# Altium schematic symbol library SCHLIB.SchLib: 2608 symbols (part 13 of 20) (continued)
## R-6.49R-0603 (continued)
RES SMD 6.49 OHM 1% 1/10W 0603; Manufacturer Part Number: CRCW06036R49FKEA; Manufacturer: Vishay Dale; Tolerance: 0.01; Power: 0.1W; Temperature Coefficient: ±100ppm/°C; Object  Type: Part; Design Item ID: R-6.49R-0603; Value: 6.49R; Composition: Thick Film; Features: Automotive AEC-Q200; Operating Temperature: -55°C ~ 155°C; Height - Seated (Max): 0.50mm; Category: Resistor
footprint R0603
pins: 1, 2

## R-6.65K-0402
designator R?, comment Package: 0402  (hidden comment: 6.65K)
RES 6.65K OHM 1% 1/16W 0402; Manufacturer Part Number: RC0402FR-076K65L; Manufacturer: YAGEO; Tolerance: 0.01; Power: 0.063W; Temperature Coefficient: ±100ppm/°C; Object  Type: Part; Design Item ID: R-6.65K-0402; Value: 6.65K; Composition: Thick Film; Features: Moisture Resistant; Operating Temperature: -55°C ~ 155°C; Height - Seated (Max): 0.40mm; Category: Resistor
footprint R0402
pins: 1, 2

## R-6.65K-0603
designator R?, comment Package: 0603  (hidden comment: 6.65K)
RES SMD 6.65K OHM 1% 1/10W 0603; Manufacturer Part Number: CRCW06036K65FKEA; Manufacturer: Vishay Dale; Tolerance: 0.01; Power: 0.1W; Temperature Coefficient: ±100ppm/°C; Object  Type: Part; Design Item ID: R-6.65K-0603; Value: 6.65K; Composition: Thick Film; Features: Automotive AEC-Q200; Operating Temperature: -55°C ~ 155°C; Height - Seated (Max): 0.50mm; Category: Resistor
footprint R0603
pins: 1, 2

## R-6.65M-0603
designator R?, comment Package: 0603  (hidden comment: 6.65M)
RES SMD 6.65M OHM 1% 1/10W 0603; Manufacturer Part Number: CRCW06036M65FKEA; Manufacturer: Vishay Dale; Tolerance: 0.01; Power: 0.1W; Temperature Coefficient: ±100ppm/°C; Object  Type: Part; Design Item ID: R-6.65M-0603; Value: 6.65M; Composition: Thick Film; Features: Automotive AEC-Q200; Operating Temperature: -55°C ~ 155°C; Height - Seated (Max): 0.50mm; Category: Resistor
footprint R0603
pins: 1, 2

## R-6.65R-0603
designator R?, comment Package: 0603  (hidden comment: 6.65R)
RES SMD 6.65 OHM 1% 1/10W 0603; Manufacturer Part Number: CRCW06036R65FKEA; Manufacturer: Vishay Dale; Tolerance: 0.01; Power: 0.1W; Temperature Coefficient: ±100ppm/°C; Object  Type: Part; Design Item ID: R-6.65R-0603; Value: 6.65R; Composition: Thick Film; Features: Automotive AEC-Q200; Operating Temperature: -55°C ~ 155°C; Height - Seated (Max): 0.50mm; Category: Resistor
footprint R0603
pins: 1, 2

## R-6.81K-0402
designator R?, comment Package: 0402  (hidden comment: 6.81K)
RES 6.81K OHM 1% 1/16W 0402; Manufacturer Part Number: RC0402FR-076K81L; Manufacturer: YAGEO; Tolerance: 0.01; Power: 0.063W; Temperature Coefficient: ±100ppm/°C; Object  Type: Part; Design Item ID: R-6.81K-0402; Value: 6.81K; Composition: Thick Film; Features: Moisture Resistant; Operating Temperature: -55°C ~ 155°C; Height - Seated (Max): 0.40mm; Category: Resistor
footprint R0402
pins: 1, 2

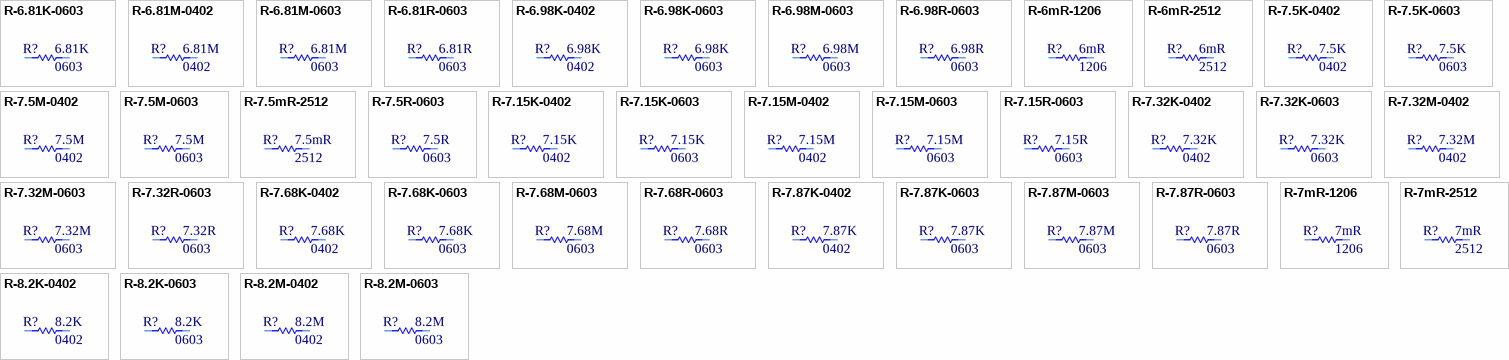
[diagram p55: symbols R-6.81K-0603 to R-8.2M-0603]

## R-6.81K-0603
designator R?, comment Package: 0603  (hidden comment: 6.81K)
RES SMD 6.81K OHM 1% 1/10W 0603; Manufacturer Part Number: CRCW06036K81FKEA; Manufacturer: Vishay Dale; Tolerance: 0.01; Power: 0.1W; Temperature Coefficient: ±100ppm/°C; Object  Type: Part; Design Item ID: R-6.81K-0603; Value: 6.81K; Composition: Thick Film; Features: Automotive AEC-Q200; Operating Temperature: -55°C ~ 155°C; Height - Seated (Max): 0.50mm; Category: Resistor
footprint R0603
pins: 1, 2

## R-6.81M-0402
designator R?, comment Package: 0402  (hidden comment: 6.81M)
RES 6.81M OHM 1% 1/16W 0402; Manufacturer Part Number: RC0402FR-076M81L; Manufacturer: YAGEO; Tolerance: 0.01; Power: 0.063W; Temperature Coefficient: ±100ppm/°C; Object  Type: Part; Design Item ID: R-6.81M-0402; Value: 6.81M; Composition: Thick Film; Features: Moisture Resistant; Operating Temperature: -55°C ~ 155°C; Height - Seated (Max): 0.40mm; Category: Resistor
footprint R0402
pins: 1, 2

## R-6.81M-0603
designator R?, comment Package: 0603  (hidden comment: 6.81M)
RES SMD 6.81M OHM 1% 1/10W 0603; Manufacturer Part Number: CRCW06036M81FKEA; Manufacturer: Vishay Dale; Tolerance: 0.01; Power: 0.1W; Temperature Coefficient: ±100ppm/°C; Object  Type: Part; Design Item ID: R-6.81M-0603; Value: 6.81M; Composition: Thick Film; Features: Automotive AEC-Q200; Operating Temperature: -55°C ~ 155°C; Height - Seated (Max): 0.50mm; Category: Resistor
footprint R0603
pins: 1, 2

## R-6.81R-0603
designator R?, comment Package: 0603  (hidden comment: 6.81R)
RES SMD 6.81 OHM 1% 1/10W 0603; Manufacturer Part Number: CRCW06036R81FKEA; Manufacturer: Vishay Dale; Tolerance: 0.01; Power: 0.1W; Temperature Coefficient: ±100ppm/°C; Object  Type: Part; Design Item ID: R-6.81R-0603; Value: 6.81R; Composition: Thick Film; Features: Automotive AEC-Q200; Operating Temperature: -55°C ~ 155°C; Height - Seated (Max): 0.50mm; Category: Resistor
footprint R0603
pins: 1, 2

## R-6.98K-0402
designator R?, comment Package: 0402  (hidden comment: 6.98K)
RES 6.98K OHM 1% 1/16W 0402; Manufacturer Part Number: RC0402FR-076K98L; Manufacturer: YAGEO; Tolerance: 0.01; Power: 0.063W; Temperature Coefficient: ±100ppm/°C; Object  Type: Part; Design Item ID: R-6.98K-0402; Value: 6.98K; Composition: Thick Film; Features: Moisture Resistant; Operating Temperature: -55°C ~ 155°C; Height - Seated (Max): 0.40mm; Category: Resistor
footprint R0402
pins: 1, 2

## R-6.98K-0603
designator R?, comment Package: 0603  (hidden comment: 6.98K)
RES SMD 6.98K OHM 1% 1/10W 0603; Manufacturer Part Number: CRCW06036K98FKEA; Manufacturer: Vishay Dale; Tolerance: 0.01; Power: 0.1W; Temperature Coefficient: ±100ppm/°C; Object  Type: Part; Design Item ID: R-6.98K-0603; Value: 6.98K; Composition: Thick Film; Features: Automotive AEC-Q200; Operating Temperature: -55°C ~ 155°C; Height - Seated (Max): 0.50mm; Category: Resistor
footprint R0603
pins: 1, 2

## R-6.98M-0603
designator R?, comment Package: 0603  (hidden comment: 6.98M)
RES SMD 6.98M OHM 1% 1/10W 0603; Manufacturer Part Number: CRCW06036M98FKEA; Manufacturer: Vishay Dale; Tolerance: 0.01; Power: 0.1W; Temperature Coefficient: ±100ppm/°C; Object  Type: Part; Design Item ID: R-6.98M-0603; Value: 6.98M; Composition: Thick Film; Features: Automotive AEC-Q200; Operating Temperature: -55°C ~ 155°C; Height - Seated (Max): 0.50mm; Category: Resistor
footprint R0603
pins: 1, 2

## R-6.98R-0603
designator R?, comment Package: 0603  (hidden comment: 6.98R)
RES SMD 6.98 OHM 1% 1/10W 0603; Manufacturer Part Number: CRCW06036R98FKEA; Manufacturer: Vishay Dale; Tolerance: 0.01; Power: 0.1W; Temperature Coefficient: ±100ppm/°C; Object  Type: Part; Design Item ID: R-6.98R-0603; Value: 6.98R; Composition: Thick Film; Features: Automotive AEC-Q200; Operating Temperature: -55°C ~ 155°C; Height - Seated (Max): 0.50mm; Category: Resistor
footprint R0603
pins: 1, 2

## R-6mR-1206
designator R?, comment Package: 1206  (hidden comment: 6mR)
RES 0.006 OHM 1% 1/4W 1206; Manufacturer Part Number: WSL12066L000FEA; Manufacturer: Vishay Dale; Tolerance: 0.01; Power: 0.25W; Temperature Coefficient: ±110ppm/°C; Object  Type: Part; Design Item ID: R-6mR-1206; Value: 6mR; Composition: Metal Element; Features: Anti-Sulfur, Automotive AEC-Q200, Current Sense, Moisture Resistant, Pulse Withstanding; Operating Temperature: -65°C ~ 170°C; Height - Seated (Max): 0.89mm; Category: Resistor
footprint R1206
pins: 1, 2

## R-6mR-2512
designator R?, comment Package: 2512  (hidden comment: 6mR)
RES 0.006 OHM 1% 1W 2512; Manufacturer Part Number: WSL25126L000FEA; Manufacturer: Vishay Dale; Tolerance: 0.01; Temperature Coefficient: ±110ppm/°C; Object  Type: Part; Design Item ID: R-6mR-2512; Value: 6mR; Power: 1W; Composition: Metal Element; Features: Anti-Sulfur, Automotive AEC-Q200, Current Sense, Moisture Resistant, Pulse Withstanding; Operating Temperature: -65°C ~ 170°C; Height - Seated (Max): 0.89mm; Category: Resistor
footprint R2512
pins: 1, 2

## R-7.5K-0402
designator R?, comment Package: 0402  (hidden comment: 7.5K)
RES 7.5K OHM 1% 1/16W 0402; Manufacturer Part Number: RC0402FR-077K5L; Manufacturer: YAGEO; Tolerance: 0.01; Power: 0.063W; Temperature Coefficient: ±100ppm/°C; Object  Type: Part; Design Item ID: R-7.5K-0402; Value: 7.5K; Composition: Thick Film; Features: Moisture Resistant; Operating Temperature: -55°C ~ 155°C; Height - Seated (Max): 0.40mm; Category: Resistor
footprint R0402
pins: 1, 2

## R-7.5K-0603
designator R?, comment Package: 0603  (hidden comment: 7.5K)
RES SMD 7.5K OHM 1% 1/10W 0603; Manufacturer Part Number: CRCW06037K50FKEA; Manufacturer: Vishay Dale; Tolerance: 0.01; Power: 0.1W; Temperature Coefficient: ±100ppm/°C; Object  Type: Part; Design Item ID: R-7.5K-0603; Value: 7.5K; Composition: Thick Film; Features: Automotive AEC-Q200; Operating Temperature: -55°C ~ 155°C; Height - Seated (Max): 0.50mm; Category: Resistor
footprint R0603
pins: 1, 2

## R-7.5M-0402
designator R?, comment Package: 0402  (hidden comment: 7.5M)
RES 7.5M OHM 1% 1/16W 0402; Manufacturer Part Number: RC0402FR-077M5L; Manufacturer: YAGEO; Tolerance: 0.01; Power: 0.063W; Temperature Coefficient: ±100ppm/°C; Object  Type: Part; Design Item ID: R-7.5M-0402; Value: 7.5M; Composition: Thick Film; Features: Moisture Resistant; Operating Temperature: -55°C ~ 155°C; Height - Seated (Max): 0.40mm; Category: Resistor
footprint R0402
pins: 1, 2

## R-7.5M-0603
designator R?, comment Package: 0603  (hidden comment: 7.5M)
RES SMD 7.5M OHM 1% 1/10W 0603; Manufacturer Part Number: CRCW06037M50FKEA; Manufacturer: Vishay Dale; Tolerance: 0.01; Power: 0.1W; Temperature Coefficient: ±100ppm/°C; Object  Type: Part; Design Item ID: R-7.5M-0603; Value: 7.5M; Composition: Thick Film; Features: Automotive AEC-Q200; Operating Temperature: -55°C ~ 155°C; Height - Seated (Max): 0.50mm; Category: Resistor
footprint R0603
pins: 1, 2

## R-7.5mR-2512
designator R?, comment Package: 2512  (hidden comment: 7.5mR)
RES 0.0075 OHM 1% 1W 2512; Manufacturer Part Number: WSL25127L500FEA; Manufacturer: Vishay Dale; Tolerance: 0.01; Temperature Coefficient: ±75ppm/°C; Object  Type: Part; Design Item ID: R-7.5mR-2512; Value: 7.5mR; Power: 1W; Composition: Metal Element; Features: Anti-Sulfur, Automotive AEC-Q200, Current Sense, Moisture Resistant, Pulse Withstanding; Operating Temperature: -65°C ~ 170°C; Height - Seated (Max): 0.89mm; Category: Resistor
footprint R2512
pins: 1, 2

## R-7.5R-0603
designator R?, comment Package: 0603  (hidden comment: 7.5R)
RES SMD 7.5 OHM 1% 1/10W 0603; Manufacturer Part Number: CRCW06037R50FKEA; Manufacturer: Vishay Dale; Tolerance: 0.01; Power: 0.1W; Temperature Coefficient: ±100ppm/°C; Object  Type: Part; Design Item ID: R-7.5R-0603; Value: 7.5R; Composition: Thick Film; Features: Automotive AEC-Q200; Operating Temperature: -55°C ~ 155°C; Height - Seated (Max): 0.50mm; Category: Resistor
footprint R0603
pins: 1, 2

## R-7.15K-0402
designator R?, comment Package: 0402  (hidden comment: 7.15K)
RES 7.15K OHM 1% 1/16W 0402; Manufacturer Part Number: RC0402FR-077K15L; Manufacturer: YAGEO; Tolerance: 0.01; Power: 0.063W; Temperature Coefficient: ±100ppm/°C; Object  Type: Part; Design Item ID: R-7.15K-0402; Value: 7.15K; Composition: Thick Film; Features: Moisture Resistant; Operating Temperature: -55°C ~ 155°C; Height - Seated (Max): 0.40mm; Category: Resistor
footprint R0402
pins: 1, 2

## R-7.15K-0603
designator R?, comment Package: 0603  (hidden comment: 7.15K)
RES SMD 7.15K OHM 1% 1/10W 0603; Manufacturer Part Number: CRCW06037K15FKEA; Manufacturer: Vishay Dale; Tolerance: 0.01; Power: 0.1W; Temperature Coefficient: ±100ppm/°C; Object  Type: Part; Design Item ID: R-7.15K-0603; Value: 7.15K; Composition: Thick Film; Features: Automotive AEC-Q200; Operating Temperature: -55°C ~ 155°C; Height - Seated (Max): 0.50mm; Category: Resistor
footprint R0603
pins: 1, 2

## R-7.15M-0402
designator R?, comment Package: 0402  (hidden comment: 7.15M)
RES 7.15M OHM 1% 1/16W 0402; Manufacturer Part Number: RC0402FR-077M15L; Manufacturer: YAGEO; Tolerance: 0.01; Power: 0.063W; Temperature Coefficient: ±100ppm/°C; Object  Type: Part; Design Item ID: R-7.15M-0402; Value: 7.15M; Composition: Thick Film; Features: Moisture Resistant; Operating Temperature: -55°C ~ 155°C; Height - Seated (Max): 0.40mm; Category: Resistor
footprint R0402
pins: 1, 2

## R-7.15M-0603
designator R?, comment Package: 0603  (hidden comment: 7.15M)
RES SMD 7.15M OHM 1% 1/10W 0603; Manufacturer Part Number: CRCW06037M15FKEA; Manufacturer: Vishay Dale; Tolerance: 0.01; Power: 0.1W; Temperature Coefficient: ±100ppm/°C; Object  Type: Part; Design Item ID: R-7.15M-0603; Value: 7.15M; Composition: Thick Film; Features: Automotive AEC-Q200; Operating Temperature: -55°C ~ 155°C; Height - Seated (Max): 0.50mm; Category: Resistor
footprint R0603
pins: 1, 2

## R-7.15R-0603
designator R?, comment Package: 0603  (hidden comment: 7.15R)
RES SMD 7.15 OHM 1% 1/10W 0603; Manufacturer Part Number: CRCW06037R15FKEA; Manufacturer: Vishay Dale; Tolerance: 0.01; Power: 0.1W; Temperature Coefficient: ±100ppm/°C; Object  Type: Part; Design Item ID: R-7.15R-0603; Value: 7.15R; Composition: Thick Film; Features: Automotive AEC-Q200; Operating Temperature: -55°C ~ 155°C; Height - Seated (Max): 0.50mm; Category: Resistor
footprint R0603
pins: 1, 2

## R-7.32K-0402
designator R?, comment Package: 0402  (hidden comment: 7.32K)
RES 7.32K OHM 1% 1/16W 0402; Manufacturer Part Number: RC0402FR-077K32L; Manufacturer: YAGEO; Tolerance: 0.01; Power: 0.063W; Temperature Coefficient: ±100ppm/°C; Object  Type: Part; Design Item ID: R-7.32K-0402; Value: 7.32K; Composition: Thick Film; Features: Moisture Resistant; Operating Temperature: -55°C ~ 155°C; Height - Seated (Max): 0.40mm; Category: Resistor
footprint R0402
pins: 1, 2

## R-7.32K-0603
designator R?, comment Package: 0603  (hidden comment: 7.32K)
RES SMD 7.32K OHM 1% 1/10W 0603; Manufacturer Part Number: CRCW06037K32FKEA; Manufacturer: Vishay Dale; Tolerance: 0.01; Power: 0.1W; Temperature Coefficient: ±100ppm/°C; Object  Type: Part; Design Item ID: R-7.32K-0603; Value: 7.32K; Composition: Thick Film; Features: Automotive AEC-Q200; Operating Temperature: -55°C ~ 155°C; Height - Seated (Max): 0.50mm; Category: Resistor
footprint R0603
pins: 1, 2

## R-7.32M-0402
designator R?, comment Package: 0402  (hidden comment: 7.32M)
RES 7.32M OHM 1% 1/16W 0402; Manufacturer Part Number: RC0402FR-077M32L; Manufacturer: YAGEO; Tolerance: 0.01; Power: 0.063W; Temperature Coefficient: ±100ppm/°C; Object  Type: Part; Design Item ID: R-7.32M-0402; Value: 7.32M; Composition: Thick Film; Features: Moisture Resistant; Operating Temperature: -55°C ~ 155°C; Height - Seated (Max): 0.40mm; Category: Resistor
footprint R0402
pins: 1, 2

## R-7.32M-0603
designator R?, comment Package: 0603  (hidden comment: 7.32M)
RES SMD 7.32M OHM 1% 1/10W 0603; Manufacturer Part Number: CRCW06037M32FKEA; Manufacturer: Vishay Dale; Tolerance: 0.01; Power: 0.1W; Temperature Coefficient: ±100ppm/°C; Object  Type: Part; Design Item ID: R-7.32M-0603; Value: 7.32M; Composition: Thick Film; Features: Automotive AEC-Q200; Operating Temperature: -55°C ~ 155°C; Height - Seated (Max): 0.50mm; Category: Resistor
footprint R0603
pins: 1, 2

## R-7.32R-0603
designator R?, comment Package: 0603  (hidden comment: 7.32R)
RES SMD 7.32 OHM 1% 1/10W 0603; Manufacturer Part Number: CRCW06037R32FKEA; Manufacturer: Vishay Dale; Tolerance: 0.01; Power: 0.1W; Temperature Coefficient: ±100ppm/°C; Object  Type: Part; Design Item ID: R-7.32R-0603; Value: 7.32R; Composition: Thick Film; Features: Automotive AEC-Q200; Operating Temperature: -55°C ~ 155°C; Height - Seated (Max): 0.50mm; Category: Resistor
footprint R0603
pins: 1, 2

## R-7.68K-0402
designator R?, comment Package: 0402  (hidden comment: 7.68K)
RES 7.68K OHM 1% 1/16W 0402; Manufacturer Part Number: RC0402FR-077K68L; Manufacturer: YAGEO; Tolerance: 0.01; Power: 0.063W; Temperature Coefficient: ±100ppm/°C; Object  Type: Part; Design Item ID: R-7.68K-0402; Value: 7.68K; Composition: Thick Film; Features: Moisture Resistant; Operating Temperature: -55°C ~ 155°C; Height - Seated (Max): 0.40mm; Category: Resistor
footprint R0402
pins: 1, 2

## R-7.68K-0603
designator R?, comment Package: 0603  (hidden comment: 7.68K)
RES SMD 7.68K OHM 1% 1/10W 0603; Manufacturer Part Number: CRCW06037K68FKEA; Manufacturer: Vishay Dale; Tolerance: 0.01; Power: 0.1W; Temperature Coefficient: ±100ppm/°C; Object  Type: Part; Design Item ID: R-7.68K-0603; Value: 7.68K; Composition: Thick Film; Features: Automotive AEC-Q200; Operating Temperature: -55°C ~ 155°C; Height - Seated (Max): 0.50mm; Category: Resistor
footprint R0603
pins: 1, 2

## R-7.68M-0603
designator R?, comment Package: 0603  (hidden comment: 7.68M)
RES SMD 7.68M OHM 1% 1/10W 0603; Manufacturer Part Number: CRCW06037M68FKEA; Manufacturer: Vishay Dale; Tolerance: 0.01; Power: 0.1W; Temperature Coefficient: ±100ppm/°C; Object  Type: Part; Design Item ID: R-7.68M-0603; Value: 7.68M; Composition: Thick Film; Features: Automotive AEC-Q200; Operating Temperature: -55°C ~ 155°C; Height - Seated (Max): 0.50mm; Category: Resistor
footprint R0603
pins: 1, 2

## R-7.68R-0603
designator R?, comment Package: 0603  (hidden comment: 7.68R)
RES SMD 7.68 OHM 1% 1/10W 0603; Manufacturer Part Number: CRCW06037R68FKEA; Manufacturer: Vishay Dale; Tolerance: 0.01; Power: 0.1W; Temperature Coefficient: ±100ppm/°C; Object  Type: Part; Design Item ID: R-7.68R-0603; Value: 7.68R; Composition: Thick Film; Features: Automotive AEC-Q200; Operating Temperature: -55°C ~ 155°C; Height - Seated (Max): 0.50mm; Category: Resistor
footprint R0603
pins: 1, 2

## R-7.87K-0402
designator R?, comment Package: 0402  (hidden comment: 7.87K)
RES 7.87K OHM 1% 1/16W 0402; Manufacturer Part Number: RC0402FR-077K87L; Manufacturer: YAGEO; Tolerance: 0.01; Power: 0.063W; Temperature Coefficient: ±100ppm/°C; Object  Type: Part; Design Item ID: R-7.87K-0402; Value: 7.87K; Composition: Thick Film; Features: Moisture Resistant; Operating Temperature: -55°C ~ 155°C; Height - Seated (Max): 0.40mm; Category: Resistor
footprint R0402
pins: 1, 2

## R-7.87K-0603
designator R?, comment Package: 0603  (hidden comment: 7.87K)
RES SMD 7.87K OHM 1% 1/10W 0603; Manufacturer Part Number: CRCW06037K87FKEA; Manufacturer: Vishay Dale; Tolerance: 0.01; Power: 0.1W; Temperature Coefficient: ±100ppm/°C; Object  Type: Part; Design Item ID: R-7.87K-0603; Value: 7.87K; Composition: Thick Film; Features: Automotive AEC-Q200; Operating Temperature: -55°C ~ 155°C; Height - Seated (Max): 0.50mm; Category: Resistor
footprint R0603
pins: 1, 2

## R-7.87M-0603
designator R?, comment Package: 0603  (hidden comment: 7.87M)
RES SMD 7.87M OHM 1% 1/10W 0603; Manufacturer Part Number: CRCW06037M87FKEA; Manufacturer: Vishay Dale; Tolerance: 0.01; Power: 0.1W; Temperature Coefficient: ±100ppm/°C; Object  Type: Part; Design Item ID: R-7.87M-0603; Value: 7.87M; Composition: Thick Film; Features: Automotive AEC-Q200; Operating Temperature: -55°C ~ 155°C; Height - Seated (Max): 0.50mm; Category: Resistor
footprint R0603
pins: 1, 2

## R-7.87R-0603
designator R?, comment Package: 0603  (hidden comment: 7.87R)
RES SMD 7.87 OHM 1% 1/10W 0603; Manufacturer Part Number: CRCW06037R87FKEA; Manufacturer: Vishay Dale; Tolerance: 0.01; Power: 0.1W; Temperature Coefficient: ±100ppm/°C; Object  Type: Part; Design Item ID: R-7.87R-0603; Value: 7.87R; Composition: Thick Film; Features: Automotive AEC-Q200; Operating Temperature: -55°C ~ 155°C; Height - Seated (Max): 0.50mm; Category: Resistor
footprint R0603
pins: 1, 2

## R-7mR-1206
designator R?, comment Package: 1206  (hidden comment: 7mR)
RES 0.007 OHM 1% 1/4W 1206; Manufacturer Part Number: WSL12067L000FEA; Manufacturer: Vishay Dale; Tolerance: 0.01; Power: 0.25W; Temperature Coefficient: ±75ppm/°C; Object  Type: Part; Design Item ID: R-7mR-1206; Value: 7mR; Composition: Metal Element; Features: Anti-Sulfur, Automotive AEC-Q200, Current Sense, Moisture Resistant, Pulse Withstanding; Operating Temperature: -65°C ~ 170°C; Height - Seated (Max): 0.89mm; Category: Resistor
footprint R1206
pins: 1, 2

## R-7mR-2512
designator R?, comment Package: 2512  (hidden comment: 7mR)
RES 0.007 OHM 1% 1W 2512; Manufacturer Part Number: WSL25127L000FEA; Manufacturer: Vishay Dale; Tolerance: 0.01; Temperature Coefficient: ±75ppm/°C; Object  Type: Part; Design Item ID: R-7mR-2512; Value: 7mR; Power: 1W; Composition: Metal Element; Features: Anti-Sulfur, Automotive AEC-Q200, Current Sense, Moisture Resistant, Pulse Withstanding; Operating Temperature: -65°C ~ 170°C; Height - Seated (Max): 0.89mm; Category: Resistor
footprint R2512
pins: 1, 2

## R-8.2K-0402
designator R?, comment Package: 0402  (hidden comment: 8.2K)
RES 8.2K OHM 1% 1/16W 0402; Manufacturer Part Number: RC0402FR-078K2L; Manufacturer: YAGEO; Tolerance: 0.01; Power: 0.063W; Temperature Coefficient: ±100ppm/°C; Object  Type: Part; Design Item ID: R-8.2K-0402; Value: 8.2K; Composition: Thick Film; Features: Moisture Resistant; Operating Temperature: -55°C ~ 155°C; Height - Seated (Max): 0.40mm; Category: Resistor
footprint R0402
pins: 1, 2

## R-8.2K-0603
designator R?, comment Package: 0603  (hidden comment: 8.2K)
RES SMD 8.2K OHM 1% 1/10W 0603; Manufacturer Part Number: CRCW06038K20FKEA; Manufacturer: Vishay Dale; Tolerance: 0.01; Power: 0.1W; Temperature Coefficient: ±100ppm/°C; Object  Type: Part; Design Item ID: R-8.2K-0603; Value: 8.2K; Composition: Thick Film; Features: Automotive AEC-Q200; Operating Temperature: -55°C ~ 155°C; Height - Seated (Max): 0.50mm; Category: Resistor
footprint R0603
pins: 1, 2

## R-8.2M-0402
designator R?, comment Package: 0402  (hidden comment: 8.2M)
RES 8.2M OHM 1% 1/16W 0402; Manufacturer Part Number: RC0402FR-078M2L; Manufacturer: YAGEO; Tolerance: 0.01; Power: 0.063W; Temperature Coefficient: ±100ppm/°C; Object  Type: Part; Design Item ID: R-8.2M-0402; Value: 8.2M; Composition: Thick Film; Features: Moisture Resistant; Operating Temperature: -55°C ~ 155°C; Height - Seated (Max): 0.40mm; Category: Resistor
footprint R0402
pins: 1, 2

## R-8.2M-0603
designator R?, comment Package: 0603  (hidden comment: 8.2M)
RES SMD 8.2M OHM 1% 1/10W 0603; Manufacturer Part Number: CRCW06038M20FKEA; Manufacturer: Vishay Dale; Tolerance: 0.01; Power: 0.1W; Temperature Coefficient: ±100ppm/°C; Object  Type: Part; Design Item ID: R-8.2M-0603; Value: 8.2M; Composition: Thick Film; Features: Automotive AEC-Q200; Operating Temperature: -55°C ~ 155°C; Height - Seated (Max): 0.50mm; Category: Resistor
footprint R0603
pins: 1, 2

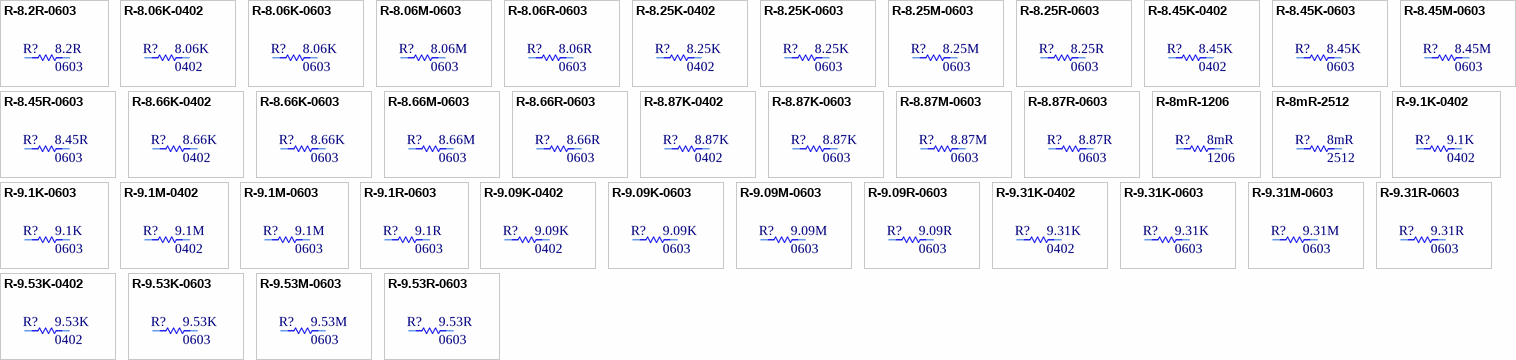
[diagram p56: symbols R-8.2R-0603 to R-9.53R-0603]

## R-8.2R-0603
designator R?, comment Package: 0603  (hidden comment: 8.2R)
RES SMD 8.2 OHM 1% 1/10W 0603; Manufacturer Part Number: CRCW06038R20FKEA; Manufacturer: Vishay Dale; Tolerance: 0.01; Power: 0.1W; Temperature Coefficient: ±100ppm/°C; Object  Type: Part; Design Item ID: R-8.2R-0603; Value: 8.2R; Composition: Thick Film; Features: Automotive AEC-Q200; Operating Temperature: -55°C ~ 155°C; Height - Seated (Max): 0.50mm; Category: Resistor
footprint R0603
pins: 1, 2

## R-8.06K-0402
designator R?, comment Package: 0402  (hidden comment: 8.06K)
RES 8.06K OHM 1% 1/16W 0402; Manufacturer Part Number: RC0402FR-078K06L; Manufacturer: YAGEO; Tolerance: 0.01; Power: 0.063W; Temperature Coefficient: ±100ppm/°C; Object  Type: Part; Design Item ID: R-8.06K-0402; Value: 8.06K; Composition: Thick Film; Features: Moisture Resistant; Operating Temperature: -55°C ~ 155°C; Height - Seated (Max): 0.40mm; Category: Resistor
footprint R0402
pins: 1, 2

## R-8.06K-0603
designator R?, comment Package: 0603  (hidden comment: 8.06K)
RES SMD 8.06K OHM 1% 1/10W 0603; Manufacturer Part Number: CRCW06038K06FKEA; Manufacturer: Vishay Dale; Tolerance: 0.01; Power: 0.1W; Temperature Coefficient: ±100ppm/°C; Object  Type: Part; Design Item ID: R-8.06K-0603; Value: 8.06K; Composition: Thick Film; Features: Automotive AEC-Q200; Operating Temperature: -55°C ~ 155°C; Height - Seated (Max): 0.50mm; Category: Resistor
footprint R0603
pins: 1, 2

## R-8.06M-0603
designator R?, comment Package: 0603  (hidden comment: 8.06M)
RES SMD 8.06M OHM 1% 1/10W 0603; Manufacturer Part Number: CRCW06038M06FKEA; Manufacturer: Vishay Dale; Tolerance: 0.01; Power: 0.1W; Temperature Coefficient: ±100ppm/°C; Object  Type: Part; Design Item ID: R-8.06M-0603; Value: 8.06M; Composition: Thick Film; Features: Automotive AEC-Q200; Operating Temperature: -55°C ~ 155°C; Height - Seated (Max): 0.50mm; Category: Resistor
footprint R0603
pins: 1, 2

## R-8.06R-0603
designator R?, comment Package: 0603  (hidden comment: 8.06R)
RES SMD 8.06 OHM 1% 1/10W 0603; Manufacturer Part Number: CRCW06038R06FKEA; Manufacturer: Vishay Dale; Tolerance: 0.01; Power: 0.1W; Temperature Coefficient: ±100ppm/°C; Object  Type: Part; Design Item ID: R-8.06R-0603; Value: 8.06R; Composition: Thick Film; Features: Automotive AEC-Q200; Operating Temperature: -55°C ~ 155°C; Height - Seated (Max): 0.50mm; Category: Resistor
footprint R0603
pins: 1, 2

## R-8.25K-0402
designator R?, comment Package: 0402  (hidden comment: 8.25K)
RES 8.25K OHM 1% 1/16W 0402; Manufacturer Part Number: RC0402FR-078K25L; Manufacturer: YAGEO; Tolerance: 0.01; Power: 0.063W; Temperature Coefficient: ±100ppm/°C; Object  Type: Part; Design Item ID: R-8.25K-0402; Value: 8.25K; Composition: Thick Film; Features: Moisture Resistant; Operating Temperature: -55°C ~ 155°C; Height - Seated (Max): 0.40mm; Category: Resistor
footprint R0402
pins: 1, 2

## R-8.25K-0603
designator R?, comment Package: 0603  (hidden comment: 8.25K)
RES SMD 8.25K OHM 1% 1/10W 0603; Manufacturer Part Number: CRCW06038K25FKEA; Manufacturer: Vishay Dale; Tolerance: 0.01; Power: 0.1W; Temperature Coefficient: ±100ppm/°C; Object  Type: Part; Design Item ID: R-8.25K-0603; Value: 8.25K; Composition: Thick Film; Features: Automotive AEC-Q200; Operating Temperature: -55°C ~ 155°C; Height - Seated (Max): 0.50mm; Category: Resistor
footprint R0603
pins: 1, 2

## R-8.25M-0603
designator R?, comment Package: 0603  (hidden comment: 8.25M)
RES SMD 8.25M OHM 1% 1/10W 0603; Manufacturer Part Number: CRCW06038M25FKEA; Manufacturer: Vishay Dale; Tolerance: 0.01; Power: 0.1W; Temperature Coefficient: ±100ppm/°C; Object  Type: Part; Design Item ID: R-8.25M-0603; Value: 8.25M; Composition: Thick Film; Features: Automotive AEC-Q200; Operating Temperature: -55°C ~ 155°C; Height - Seated (Max): 0.50mm; Category: Resistor
footprint R0603
pins: 1, 2

## R-8.25R-0603
designator R?, comment Package: 0603  (hidden comment: 8.25R)
RES SMD 8.25 OHM 1% 1/10W 0603; Manufacturer Part Number: CRCW06038R25FKEA; Manufacturer: Vishay Dale; Tolerance: 0.01; Power: 0.1W; Temperature Coefficient: ±100ppm/°C; Object  Type: Part; Design Item ID: R-8.25R-0603; Value: 8.25R; Composition: Thick Film; Features: Automotive AEC-Q200; Operating Temperature: -55°C ~ 155°C; Height - Seated (Max): 0.50mm; Category: Resistor
footprint R0603
pins: 1, 2

## R-8.45K-0402
designator R?, comment Package: 0402  (hidden comment: 8.45K)
RES 8.45K OHM 1% 1/16W 0402; Manufacturer Part Number: RC0402FR-078K45L; Manufacturer: YAGEO; Tolerance: 0.01; Power: 0.063W; Temperature Coefficient: ±100ppm/°C; Object  Type: Part; Design Item ID: R-8.45K-0402; Value: 8.45K; Composition: Thick Film; Features: Moisture Resistant; Operating Temperature: -55°C ~ 155°C; Height - Seated (Max): 0.40mm; Category: Resistor
footprint R0402
pins: 1, 2

## R-8.45K-0603
designator R?, comment Package: 0603  (hidden comment: 8.45K)
RES SMD 8.45K OHM 1% 1/10W 0603; Manufacturer Part Number: CRCW06038K45FKEA; Manufacturer: Vishay Dale; Tolerance: 0.01; Power: 0.1W; Temperature Coefficient: ±100ppm/°C; Object  Type: Part; Design Item ID: R-8.45K-0603; Value: 8.45K; Composition: Thick Film; Features: Automotive AEC-Q200; Operating Temperature: -55°C ~ 155°C; Height - Seated (Max): 0.50mm; Category: Resistor
footprint R0603
pins: 1, 2

## R-8.45M-0603
designator R?, comment Package: 0603  (hidden comment: 8.45M)
RES SMD 8.45M OHM 1% 1/10W 0603; Manufacturer Part Number: CRCW06038M45FKEA; Manufacturer: Vishay Dale; Tolerance: 0.01; Power: 0.1W; Temperature Coefficient: ±100ppm/°C; Object  Type: Part; Design Item ID: R-8.45M-0603; Value: 8.45M; Composition: Thick Film; Features: Automotive AEC-Q200; Operating Temperature: -55°C ~ 155°C; Height - Seated (Max): 0.50mm; Category: Resistor
footprint R0603
pins: 1, 2

## R-8.45R-0603
designator R?, comment Package: 0603  (hidden comment: 8.45R)
RES SMD 8.45 OHM 1% 1/10W 0603; Manufacturer Part Number: CRCW06038R45FKEA; Manufacturer: Vishay Dale; Tolerance: 0.01; Power: 0.1W; Temperature Coefficient: ±100ppm/°C; Object  Type: Part; Design Item ID: R-8.45R-0603; Value: 8.45R; Composition: Thick Film; Features: Automotive AEC-Q200; Operating Temperature: -55°C ~ 155°C; Height - Seated (Max): 0.50mm; Category: Resistor
footprint R0603
pins: 1, 2

## R-8.66K-0402
designator R?, comment Package: 0402  (hidden comment: 8.66K)
RES 8.66K OHM 1% 1/16W 0402; Manufacturer Part Number: RC0402FR-078K66L; Manufacturer: YAGEO; Tolerance: 0.01; Power: 0.063W; Temperature Coefficient: ±100ppm/°C; Object  Type: Part; Design Item ID: R-8.66K-0402; Value: 8.66K; Composition: Thick Film; Features: Moisture Resistant; Operating Temperature: -55°C ~ 155°C; Height - Seated (Max): 0.40mm; Category: Resistor
footprint R0402
pins: 1, 2

## R-8.66K-0603
designator R?, comment Package: 0603  (hidden comment: 8.66K)
RES SMD 8.66K OHM 1% 1/10W 0603; Manufacturer Part Number: CRCW06038K66FKEA; Manufacturer: Vishay Dale; Tolerance: 0.01; Power: 0.1W; Temperature Coefficient: ±100ppm/°C; Object  Type: Part; Design Item ID: R-8.66K-0603; Value: 8.66K; Composition: Thick Film; Features: Automotive AEC-Q200; Operating Temperature: -55°C ~ 155°C; Height - Seated (Max): 0.50mm; Category: Resistor
footprint R0603
pins: 1, 2

## R-8.66M-0603
designator R?, comment Package: 0603  (hidden comment: 8.66M)
RES SMD 8.66M OHM 1% 1/10W 0603; Manufacturer Part Number: CRCW06038M66FKEA; Manufacturer: Vishay Dale; Tolerance: 0.01; Power: 0.1W; Temperature Coefficient: ±100ppm/°C; Object  Type: Part; Design Item ID: R-8.66M-0603; Value: 8.66M; Composition: Thick Film; Features: Automotive AEC-Q200; Operating Temperature: -55°C ~ 155°C; Height - Seated (Max): 0.50mm; Category: Resistor
footprint R0603
pins: 1, 2

## R-8.66R-0603
designator R?, comment Package: 0603  (hidden comment: 8.66R)
RES SMD 8.66 OHM 1% 1/10W 0603; Manufacturer Part Number: CRCW06038R66FKEA; Manufacturer: Vishay Dale; Tolerance: 0.01; Power: 0.1W; Temperature Coefficient: ±100ppm/°C; Object  Type: Part; Design Item ID: R-8.66R-0603; Value: 8.66R; Composition: Thick Film; Features: Automotive AEC-Q200; Operating Temperature: -55°C ~ 155°C; Height - Seated (Max): 0.50mm; Category: Resistor
footprint R0603
pins: 1, 2

## R-8.87K-0402
designator R?, comment Package: 0402  (hidden comment: 8.87K)
RES 8.87K OHM 1% 1/16W 0402; Manufacturer Part Number: RC0402FR-078K87L; Manufacturer: YAGEO; Tolerance: 0.01; Power: 0.063W; Temperature Coefficient: ±100ppm/°C; Object  Type: Part; Design Item ID: R-8.87K-0402; Value: 8.87K; Composition: Thick Film; Features: Moisture Resistant; Operating Temperature: -55°C ~ 155°C; Height - Seated (Max): 0.40mm; Category: Resistor
footprint R0402
pins: 1, 2

## R-8.87K-0603
designator R?, comment Package: 0603  (hidden comment: 8.87K)
RES SMD 8.87K OHM 1% 1/10W 0603; Manufacturer Part Number: CRCW06038K87FKEA; Manufacturer: Vishay Dale; Tolerance: 0.01; Power: 0.1W; Temperature Coefficient: ±100ppm/°C; Object  Type: Part; Design Item ID: R-8.87K-0603; Value: 8.87K; Composition: Thick Film; Features: Automotive AEC-Q200; Operating Temperature: -55°C ~ 155°C; Height - Seated (Max): 0.50mm; Category: Resistor
footprint R0603
pins: 1, 2

## R-8.87M-0603
designator R?, comment Package: 0603  (hidden comment: 8.87M)
RES SMD 8.87M OHM 1% 1/10W 0603; Manufacturer Part Number: CRCW06038M87FKEA; Manufacturer: Vishay Dale; Tolerance: 0.01; Power: 0.1W; Temperature Coefficient: ±100ppm/°C; Object  Type: Part; Design Item ID: R-8.87M-0603; Value: 8.87M; Composition: Thick Film; Features: Automotive AEC-Q200; Operating Temperature: -55°C ~ 155°C; Height - Seated (Max): 0.50mm; Category: Resistor
footprint R0603
pins: 1, 2

## R-8.87R-0603
designator R?, comment Package: 0603  (hidden comment: 8.87R)
RES SMD 8.87 OHM 1% 1/10W 0603; Manufacturer Part Number: CRCW06038R87FKEA; Manufacturer: Vishay Dale; Tolerance: 0.01; Power: 0.1W; Temperature Coefficient: ±100ppm/°C; Object  Type: Part; Design Item ID: R-8.87R-0603; Value: 8.87R; Composition: Thick Film; Features: Automotive AEC-Q200; Operating Temperature: -55°C ~ 155°C; Height - Seated (Max): 0.50mm; Category: Resistor
footprint R0603
pins: 1, 2

## R-8mR-1206
designator R?, comment Package: 1206  (hidden comment: 8mR)
RES 0.008 OHM 1% 1/4W 1206; Manufacturer Part Number: WSL12068L000FEA; Manufacturer: Vishay Dale; Tolerance: 0.01; Power: 0.25W; Temperature Coefficient: ±75ppm/°C; Object  Type: Part; Design Item ID: R-8mR-1206; Value: 8mR; Composition: Metal Element; Features: Anti-Sulfur, Automotive AEC-Q200, Current Sense, Moisture Resistant, Pulse Withstanding; Operating Temperature: -65°C ~ 170°C; Height - Seated (Max): 0.89mm; Category: Resistor
footprint R1206
pins: 1, 2

## R-8mR-2512
designator R?, comment Package: 2512  (hidden comment: 8mR)
RES 0.008 OHM 1% 1W 2512; Manufacturer Part Number: WSL25128L000FEA; Manufacturer: Vishay Dale; Tolerance: 0.01; Temperature Coefficient: ±75ppm/°C; Object  Type: Part; Design Item ID: R-8mR-2512; Value: 8mR; Power: 1W; Composition: Metal Element; Features: Anti-Sulfur, Automotive AEC-Q200, Current Sense, Moisture Resistant, Pulse Withstanding; Operating Temperature: -65°C ~ 170°C; Height - Seated (Max): 0.89mm; Category: Resistor
footprint R2512
pins: 1, 2

## R-9.1K-0402
designator R?, comment Package: 0402  (hidden comment: 9.1K)
RES 9.1K OHM 1% 1/16W 0402; Manufacturer Part Number: RC0402FR-079K1L; Manufacturer: YAGEO; Tolerance: 0.01; Power: 0.063W; Temperature Coefficient: ±100ppm/°C; Object  Type: Part; Design Item ID: R-9.1K-0402; Value: 9.1K; Composition: Thick Film; Features: Moisture Resistant; Operating Temperature: -55°C ~ 155°C; Height - Seated (Max): 0.40mm; Category: Resistor
footprint R0402
pins: 1, 2

## R-9.1K-0603
designator R?, comment Package: 0603  (hidden comment: 9.1K)
RES SMD 9.1K OHM 1% 1/10W 0603; Manufacturer Part Number: CRCW06039K10FKEA; Manufacturer: Vishay Dale; Tolerance: 0.01; Power: 0.1W; Temperature Coefficient: ±100ppm/°C; Object  Type: Part; Design Item ID: R-9.1K-0603; Value: 9.1K; Composition: Thick Film; Features: Automotive AEC-Q200; Operating Temperature: -55°C ~ 155°C; Height - Seated (Max): 0.50mm; Category: Resistor
footprint R0603
pins: 1, 2

## R-9.1M-0402
designator R?, comment Package: 0402  (hidden comment: 9.1M)
RES 9.1M OHM 1% 1/16W 0402; Manufacturer Part Number: RC0402FR-079M1L; Manufacturer: YAGEO; Tolerance: 0.01; Power: 0.063W; Temperature Coefficient: ±100ppm/°C; Object  Type: Part; Design Item ID: R-9.1M-0402; Value: 9.1M; Composition: Thick Film; Features: Moisture Resistant; Operating Temperature: -55°C ~ 155°C; Height - Seated (Max): 0.40mm; Category: Resistor
footprint R0402
pins: 1, 2

## R-9.1M-0603
designator R?, comment Package: 0603  (hidden comment: 9.1M)
RES SMD 9.1M OHM 1% 1/10W 0603; Manufacturer Part Number: CRCW06039M10FKEA; Manufacturer: Vishay Dale; Tolerance: 0.01; Power: 0.1W; Temperature Coefficient: ±100ppm/°C; Object  Type: Part; Design Item ID: R-9.1M-0603; Value: 9.1M; Composition: Thick Film; Features: Automotive AEC-Q200; Operating Temperature: -55°C ~ 155°C; Height - Seated (Max): 0.50mm; Category: Resistor
footprint R0603
pins: 1, 2

## R-9.1R-0603
designator R?, comment Package: 0603  (hidden comment: 9.1R)
RES SMD 9.1 OHM 1% 1/10W 0603; Manufacturer Part Number: CRCW06039R10FKEA; Manufacturer: Vishay Dale; Tolerance: 0.01; Power: 0.1W; Temperature Coefficient: ±100ppm/°C; Object  Type: Part; Design Item ID: R-9.1R-0603; Value: 9.1R; Composition: Thick Film; Features: Automotive AEC-Q200; Operating Temperature: -55°C ~ 155°C; Height - Seated (Max): 0.50mm; Category: Resistor
footprint R0603
pins: 1, 2

## R-9.09K-0402
designator R?, comment Package: 0402  (hidden comment: 9.09K)
RES 9.09K OHM 1% 1/16W 0402; Manufacturer Part Number: RC0402FR-079K09L; Manufacturer: YAGEO; Tolerance: 0.01; Power: 0.063W; Temperature Coefficient: ±100ppm/°C; Object  Type: Part; Design Item ID: R-9.09K-0402; Value: 9.09K; Composition: Thick Film; Features: Moisture Resistant; Operating Temperature: -55°C ~ 155°C; Height - Seated (Max): 0.40mm; Category: Resistor
footprint R0402
pins: 1, 2

## R-9.09K-0603
designator R?, comment Package: 0603  (hidden comment: 9.09K)
RES SMD 9.09K OHM 1% 1/10W 0603; Manufacturer Part Number: CRCW06039K09FKEA; Manufacturer: Vishay Dale; Tolerance: 0.01; Power: 0.1W; Temperature Coefficient: ±100ppm/°C; Object  Type: Part; Design Item ID: R-9.09K-0603; Value: 9.09K; Composition: Thick Film; Features: Automotive AEC-Q200; Operating Temperature: -55°C ~ 155°C; Height - Seated (Max): 0.50mm; Category: Resistor
footprint R0603
pins: 1, 2

## R-9.09M-0603
designator R?, comment Package: 0603  (hidden comment: 9.09M)
RES SMD 9.09M OHM 1% 1/10W 0603; Manufacturer Part Number: CRCW06039M09FKEA; Manufacturer: Vishay Dale; Tolerance: 0.01; Power: 0.1W; Temperature Coefficient: ±100ppm/°C; Object  Type: Part; Design Item ID: R-9.09M-0603; Value: 9.09M; Composition: Thick Film; Features: Automotive AEC-Q200; Operating Temperature: -55°C ~ 155°C; Height - Seated (Max): 0.50mm; Category: Resistor
footprint R0603
pins: 1, 2

## R-9.09R-0603
designator R?, comment Package: 0603  (hidden comment: 9.09R)
RES SMD 9.09 OHM 1% 1/10W 0603; Manufacturer Part Number: CRCW06039R09FKEA; Manufacturer: Vishay Dale; Tolerance: 0.01; Power: 0.1W; Temperature Coefficient: ±100ppm/°C; Object  Type: Part; Design Item ID: R-9.09R-0603; Value: 9.09R; Composition: Thick Film; Features: Automotive AEC-Q200; Operating Temperature: -55°C ~ 155°C; Height - Seated (Max): 0.50mm; Category: Resistor
footprint R0603
pins: 1, 2

## R-9.31K-0402
designator R?, comment Package: 0402  (hidden comment: 9.31K)
RES 9.31K OHM 1% 1/16W 0402; Manufacturer Part Number: RC0402FR-079K31L; Manufacturer: YAGEO; Tolerance: 0.01; Power: 0.063W; Temperature Coefficient: ±100ppm/°C; Object  Type: Part; Design Item ID: R-9.31K-0402; Value: 9.31K; Composition: Thick Film; Features: Moisture Resistant; Operating Temperature: -55°C ~ 155°C; Height - Seated (Max): 0.40mm; Category: Resistor
footprint R0402
pins: 1, 2

## R-9.31K-0603
designator R?, comment Package: 0603  (hidden comment: 9.31K)
RES SMD 9.31K OHM 1% 1/10W 0603; Manufacturer Part Number: CRCW06039K31FKEA; Manufacturer: Vishay Dale; Tolerance: 0.01; Power: 0.1W; Temperature Coefficient: ±100ppm/°C; Object  Type: Part; Design Item ID: R-9.31K-0603; Value: 9.31K; Composition: Thick Film; Features: Automotive AEC-Q200; Operating Temperature: -55°C ~ 155°C; Height - Seated (Max): 0.50mm; Category: Resistor
footprint R0603
pins: 1, 2

## R-9.31M-0603
designator R?, comment Package: 0603  (hidden comment: 9.31M)
RES SMD 9.31M OHM 1% 1/10W 0603; Manufacturer Part Number: CRCW06039M31FKEA; Manufacturer: Vishay Dale; Tolerance: 0.01; Power: 0.1W; Temperature Coefficient: ±100ppm/°C; Object  Type: Part; Design Item ID: R-9.31M-0603; Value: 9.31M; Composition: Thick Film; Features: Automotive AEC-Q200; Operating Temperature: -55°C ~ 155°C; Height - Seated (Max): 0.50mm; Category: Resistor
footprint R0603
pins: 1, 2

## R-9.31R-0603
designator R?, comment Package: 0603  (hidden comment: 9.31R)
RES SMD 9.31 OHM 1% 1/10W 0603; Manufacturer Part Number: CRCW06039R31FKEA; Manufacturer: Vishay Dale; Tolerance: 0.01; Power: 0.1W; Temperature Coefficient: ±100ppm/°C; Object  Type: Part; Design Item ID: R-9.31R-0603; Value: 9.31R; Composition: Thick Film; Features: Automotive AEC-Q200; Operating Temperature: -55°C ~ 155°C; Height - Seated (Max): 0.50mm; Category: Resistor
footprint R0603
pins: 1, 2

## R-9.53K-0402
designator R?, comment Package: 0402  (hidden comment: 9.53K)
RES 9.53K OHM 1% 1/16W 0402; Manufacturer Part Number: RC0402FR-079K53L; Manufacturer: YAGEO; Tolerance: 0.01; Power: 0.063W; Temperature Coefficient: ±100ppm/°C; Object  Type: Part; Design Item ID: R-9.53K-0402; Value: 9.53K; Composition: Thick Film; Features: Moisture Resistant; Operating Temperature: -55°C ~ 155°C; Height - Seated (Max): 0.40mm; Category: Resistor
footprint R0402
pins: 1, 2

## R-9.53K-0603
designator R?, comment Package: 0603  (hidden comment: 9.53K)
RES SMD 9.53K OHM 1% 1/10W 0603; Manufacturer Part Number: CRCW06039K53FKEA; Manufacturer: Vishay Dale; Tolerance: 0.01; Power: 0.1W; Temperature Coefficient: ±100ppm/°C; Object  Type: Part; Design Item ID: R-9.53K-0603; Value: 9.53K; Composition: Thick Film; Features: Automotive AEC-Q200; Operating Temperature: -55°C ~ 155°C; Height - Seated (Max): 0.50mm; Category: Resistor
footprint R0603
pins: 1, 2

## R-9.53M-0603
designator R?, comment Package: 0603  (hidden comment: 9.53M)
RES SMD 9.53M OHM 1% 1/10W 0603; Manufacturer Part Number: CRCW06039M53FKEA; Manufacturer: Vishay Dale; Tolerance: 0.01; Power: 0.1W; Temperature Coefficient: ±100ppm/°C; Object  Type: Part; Design Item ID: R-9.53M-0603; Value: 9.53M; Composition: Thick Film; Features: Automotive AEC-Q200; Operating Temperature: -55°C ~ 155°C; Height - Seated (Max): 0.50mm; Category: Resistor
footprint R0603
pins: 1, 2

## R-9.53R-0603
designator R?, comment Package: 0603  (hidden comment: 9.53R)
RES SMD 9.53 OHM 1% 1/10W 0603; Manufacturer Part Number: CRCW06039R53FKEA; Manufacturer: Vishay Dale; Tolerance: 0.01; Power: 0.1W; Temperature Coefficient: ±100ppm/°C; Object  Type: Part; Design Item ID: R-9.53R-0603; Value: 9.53R; Composition: Thick Film; Features: Automotive AEC-Q200; Operating Temperature: -55°C ~ 155°C; Height - Seated (Max): 0.50mm; Category: Resistor
footprint R0603
pins: 1, 2

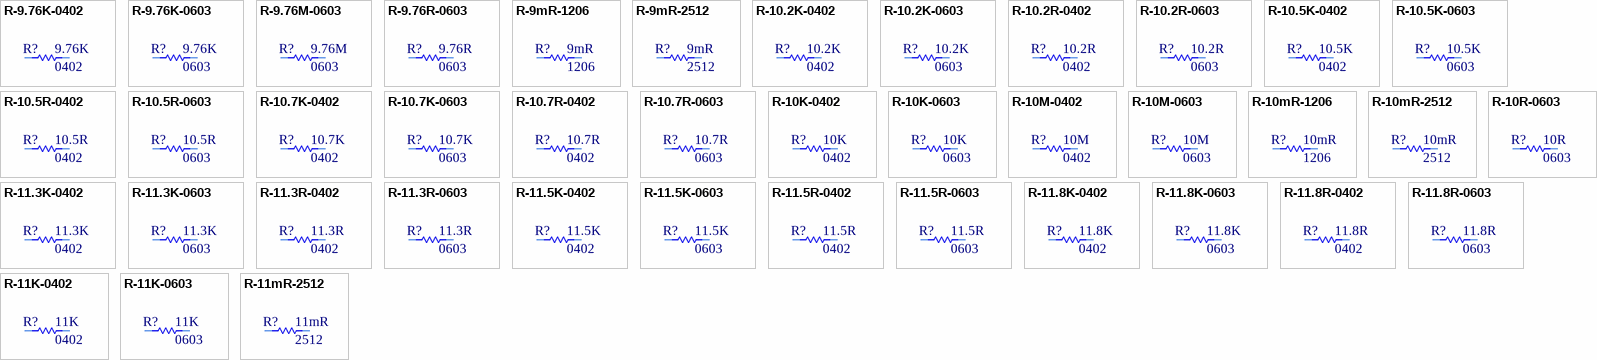
[diagram p57: symbols R-9.76K-0402 to R-11mR-2512]